# Altium footprint library connector.PcbLib: 227 footprints (part 2 of 15)
Each footprint in its own frame and in the unit in brackets; x right, y up, seen from the top. Pads: shape width x height; smd on the part's side, far side on the other; paste and mask are expansions set on the pad; w line width, h text height; cw(c..) or ccw(c..) is an arc to the next point about the centre after c.
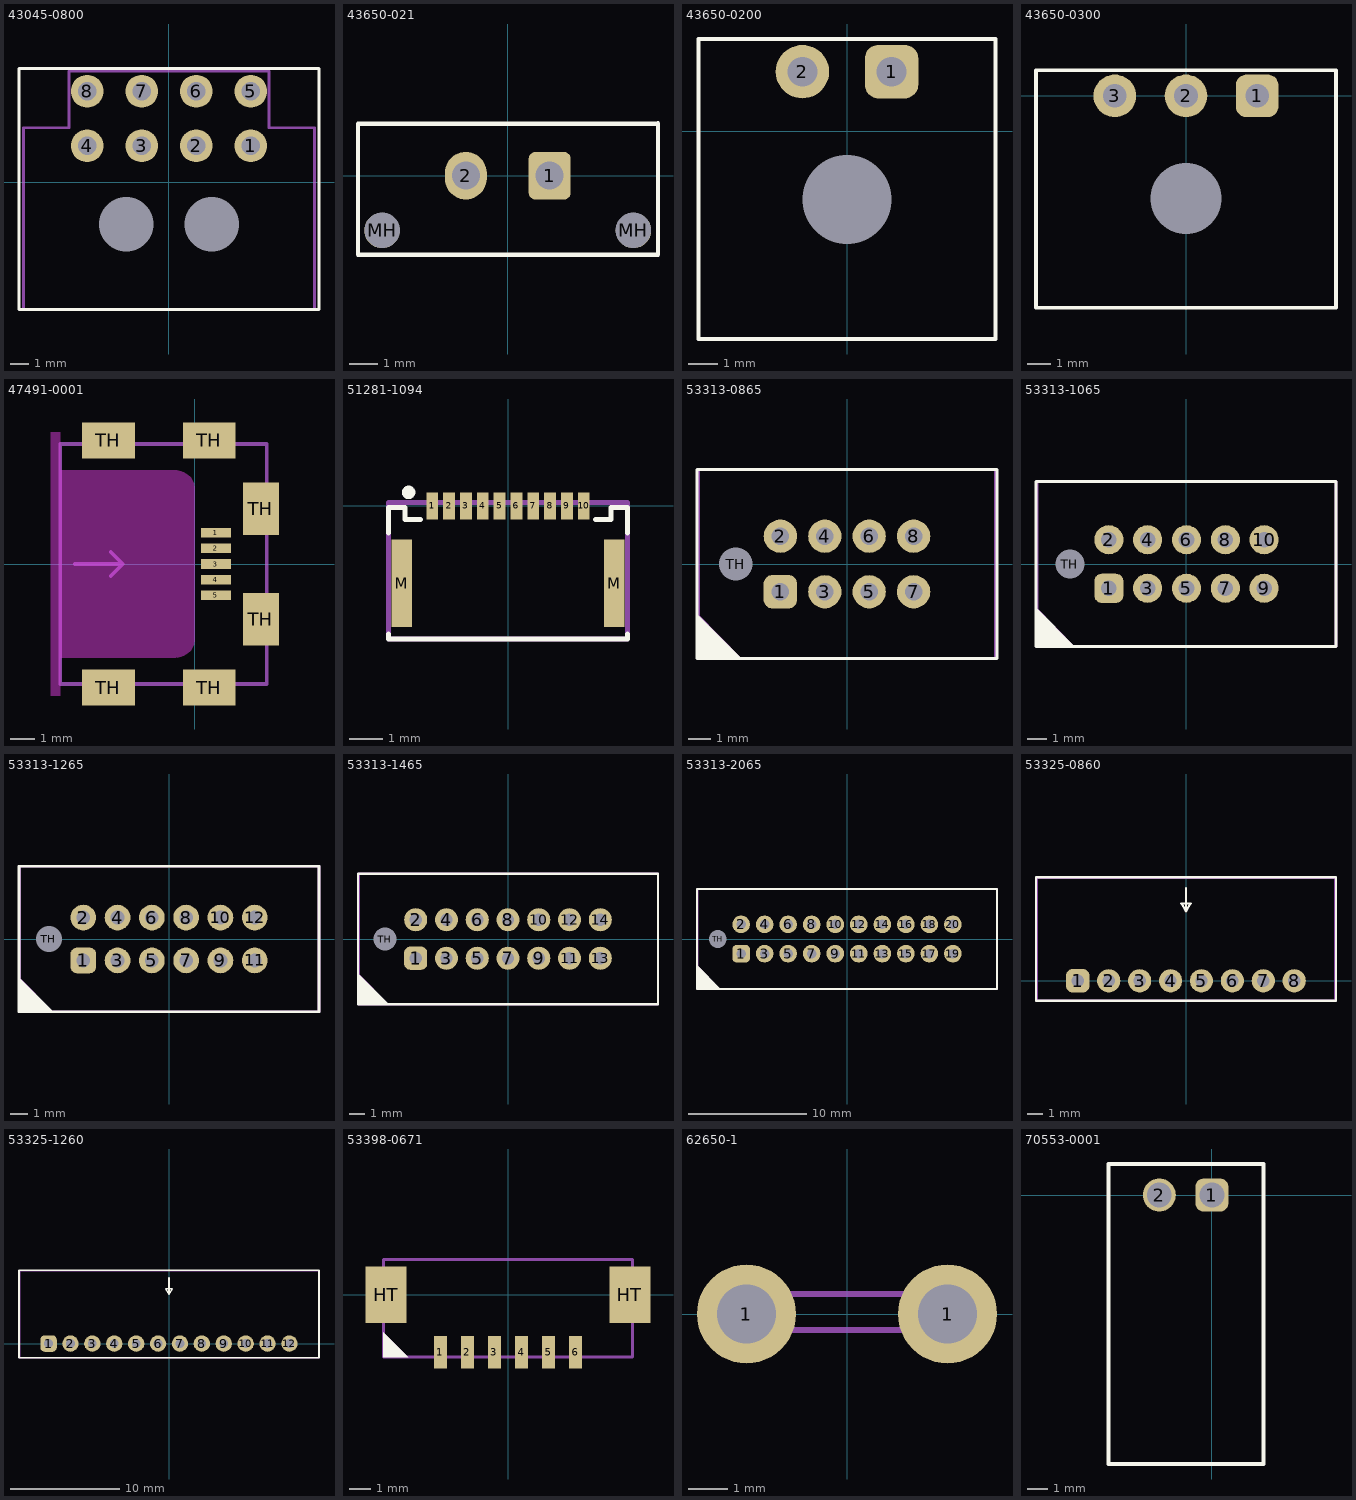
[diagram p1: the footprints below, top view; thin cyan lines are the x and y axes]

## 43045-0800 [mm] "Molex, Micro-Fit 3.0пїЅ Right Angle Header, 3.00mm Pitch, Dual Row, 8 Circuits, with Snap-in Plastic Peg PCB Lock, Tin, Glow Wire Capable, Black"
height 8.77
pads (10):
  round 1.8 hole 1: 1(4.5,2) 2(1.5,2) 3(-1.5,2) 4(-4.5,2) 5(4.5,5) 6(1.5,5) 7(-1.5,5) 8(-4.5,5)
  round 0 hole 3 unplated: MTB(-2.34,-2.32) MTB(2.34,-2.32)
Top Overlay:
  lines w0.15: -8.25,-7 8.25,-7 8.25,6.25 -8.25,6.25 -8.25,-7
Top Courtyard:
  lines w0.15: -8,-7 0,-7 8,-7 8,3 5.5,3 5.5,6.1 0,6.1 -5.5,6.1 -5.5,3 -8,3 -8,-7
3D body "430450800.stp": height 8.77, standoff -3.18, extent -8.075,-6.92 8.075,5.32

## 43650-021 [mm]
pads (4):
  rrect30% 1.5x1.7 hole 1: 1(1.5,0)
  oval 1.5x1.7 hole 1: 2(-1.5,0)
  round 1.27 hole 1.27 unplated: MH(-4.5,-1.96) MH(4.5,-1.96)
Top Overlay:
  lines w0.15: 5.378,1.861 -5.36,1.861 -5.36,-2.83 5.378,-2.83 5.378,1.879
3D body "436500215.stp": height 9.95, standoff -3.13, extent -4.825,-2.47 4.825,3.135

## 43650-0200 [mm]
pads (3):
  rrect50% 1.8x1.8 hole 1: 1(1.5,2)
  round 1.8 hole 1: 2(-1.5,2)
  round 0 hole 3 unplated: MTB(0,-2.3)
Top Overlay:
  lines w0.15: -5,-7 5,-7 5,3.1 -5,3.1 -5,-7
3D body "436500200.stp": height 5.64, standoff -3.27, extent -4.825,-6.85 4.825,3.05

## 43650-0300 [mm]
pads (4):
  rrect50% 1.8x1.8 hole 1: 1(3,0)
  round 1.8 hole 1: 2(0,0) 3(-3,0)
  round 0 hole 3 unplated: MTB(0,-4.32)
Top Overlay:
  lines w0.15: -6.325,-8.934 6.325,-8.934 6.325,1.081 -6.325,1.081 -6.325,-8.934
3D body "436500300.stp": height 5.64, standoff -3.27, extent -6.325,-8.95 6.325,0.95

## 47491-0001 [mm]
pads (11):
  rect 1.25x0.4 smd: 1(0.875,1.3) 2(0.875,0.65) 3(0.875,0) 4(0.875,-0.65) 5(0.875,-1.3)
  rect 2.2x1.5 smd: TH(-3.6,-5.15) TH(-3.6,5.15) TH(0.6,-5.15) TH(0.6,5.15)
  rect 1.5x2.2 smd: TH(2.75,-2.3) TH(2.75,2.3)
Keep-Out Layer:
  board cut-out: -6,-5.5 -6,5.5 -5.6,5.5 -5.6,3.9 -0.8,3.9 -0.721,3.9 -0.567,3.869 -0.421,3.809 -0.29,3.721 -0.179,3.61 -0.091,3.479 -0.031,3.333 0,3.179 0,3.1 0,-3.1 0,-3.179 -0.031,-3.333 -0.091,-3.479 -0.179,-3.61 -0.29,-3.721 -0.421,-3.809 -0.567,-3.869 -0.721,-3.9 -0.8,-3.9 -5.6,-3.9 -5.6,-5.5
Mechanical 29:
  lines w0.15: -5,0 -3,0 ; -3.5,-0.5 -3,0 ; -3.5,0.5 -3,0 ; -5.6,-5 3,-5 3,5 -5.6,5 -5.6,-5
  text ".Designator" at -4.5,2.7 h1
3D body "474910001.stp": height 1.47, standoff -1.47, extent -5.905,-5.5 3.225,5.5

## 51281-1094 [mm]
pads (12):
  rect 0.35x0.8 smd: 1(-2.25,0) 2(-1.75,0) 3(-1.25,0) 4(-0.75,0) 5(-0.25,0) 6(0.25,0) 7(0.75,0) 8(1.25,0) 9(1.75,0) 10(2.25,0)
  rect 0.6x2.6 smd: M(-3.15,-2.3) M(3.15,-2.3)
Top Overlay:
  circle w0.2: c-2.95,0.4 r0.1
  lines w0.15: -3.55,-3.8 -3.55,-3.95 3.55,-3.95 3.55,-3.8 ; -3.55,-0.8 -3.55,-0.05 -3.05,-0.05 -3.05,-0.4 -2.9,-0.4 -2.6,-0.4 ; 2.6,-0.4 2.9,-0.4 3.05,-0.4 3.05,-0.05 3.55,-0.05 3.55,-0.8
Top Courtyard:
  lines w0.15: -3.55,-3.95 3.55,-3.95 3.55,0.1 -3.55,0.1 -3.55,-3.95
3D body "512811094.stp": height 1.2, standoff 0, extent -3.55,-3.95 3.55,0.1

## 53313-0865 [mm]
height 7
pads (9):
  rrect50% 1.5x1.5 hole 0.8: 1(-3,-1.25)
  round 1.5 hole 0.8: 2(-3,1.25) 3(-1,-1.25) 4(-1,1.25) 5(1,-1.25) 6(1,1.25) 7(3,-1.25) 8(3,1.25)
  round 1 hole 1.5: TH(-5,0)
Top Overlay:
  region: -6.75,-2.25 -6.75,-4.25 -4.75,-4.25
  lines w0.15: -6.75,-4.25 -6.75,4.25 6.75,4.25 6.75,-4.25 -6.75,-4.25
Mechanical 29:
  region: -6.7,-2.257 -6.7,-4.25 -4.764,-4.25
  lines w0.15: -6.7,-4.25 6.7,-4.25 6.7,4.25 -6.7,4.25 -6.7,-4.25
  text ".Designator" at -3,-0.3 h1
3D body "533130865.stp": height 6.75, standoff -3.25, extent -6.7,-4.25 6.7,4.25

## 53313-1065 [mm]
height 7
pads (11):
  rrect50% 1.5x1.5 hole 0.8: 1(-4,-1.25)
  round 1.5 hole 0.8: 2(-4,1.25) 3(-2,-1.25) 4(-2,1.25) 5(0,-1.25) 6(0,1.25) 7(2,-1.25) 8(2,1.25) 9(4,-1.25) 10(4,1.25)
  round 1 hole 1.5: TH(-6,0)
Top Overlay:
  region: -7.75,-2.25 -7.75,-4.25 -5.75,-4.25
  lines w0.15: -7.75,-4.25 7.7,-4.25 7.7,4.25 -7.75,4.25 -7.75,-4.25
Mechanical 29:
  region: -7.7,-2.257 -7.7,-4.25 -5.764,-4.25
  lines w0.15: -7.7,-4.25 -7.7,4.25 7.7,4.25 7.7,-4.25 -7.7,-4.25
  text ".Designator" at -3,-0.3 h1
3D body "533131065.stp": height 6.75, standoff -3.25, extent -7.7,-4.25 7.7,4.25

## 53313-1265 [mm]
pads (13):
  rrect50% 1.5x1.5 hole 0.8: 1(-5,-1.25)
  round 1.5 hole 0.8: 2(-5,1.25) 3(-3,-1.25) 4(-3,1.25) 5(-1,-1.25) 6(-1,1.25) 7(1,-1.25) 8(1,1.25) 9(3,-1.25) 10(3,1.25) 11(5,-1.25) 12(5,1.25)
  round 1 hole 1.5: TH(-7,0)
Top Overlay:
  region: -8.75,-2.25 -8.75,-4.25 -6.75,-4.25
  lines w0.15: -8.75,-4.25 8.75,-4.25 8.75,4.25 -8.75,4.25 -8.75,-4.25
Mechanical 29:
  region: -8.7,-2.257 -8.7,-4.25 -6.764,-4.25
  lines w0.15: -8.7,-4.25 -8.7,4.25 8.75,4.25 8.75,-4.25 -8.7,-4.25
  text ".Designator" at -3,-0.3 h1
3D body "533131265.stp": height 6.75, standoff -3.25, extent -8.7,-4.25 8.7,4.25

## 53313-1465 [mm]
height 7
pads (15):
  rrect50% 1.5x1.5 hole 0.8: 1(-6,-1.25)
  round 1.5 hole 0.8: 2(-6,1.25) 3(-4,-1.25) 4(-4,1.25) 5(-2,-1.25) 6(-2,1.25) 7(0,-1.25) 8(0,1.25) 9(2,-1.25) 10(2,1.25) 11(4,-1.25) 12(4,1.25) 13(6,-1.25) 14(6,1.25)
  round 1 hole 1.5: TH(-8,0)
Top Overlay:
  region: -9.75,-2.25 -9.75,-4.25 -7.75,-4.25
  lines w0.15: -9.75,-4.25 -9.75,4.25 9.75,4.25 9.75,-4.25 -9.75,-4.25
Mechanical 29:
  region: -9.7,-2.257 -9.7,-4.25 -7.764,-4.25
  lines w0.15: -9.7,-4.25 9.75,-4.25 9.75,4.25 -9.7,4.25 -9.7,-4.25
  text ".Designator" at -3.5,-0.3 h1
3D body "533131465.stp": height 6.75, standoff -3.25, extent -9.7,-4.25 9.7,4.25

## 53313-2065 [mm]
height 7
pads (21):
  rrect50% 1.5x1.5 hole 0.8: 1(-9,-1.25)
  round 1.5 hole 0.8: 2(-9,1.25) 3(-7,-1.25) 4(-7,1.25) 5(-5,-1.25) 6(-5,1.25) 7(-3,-1.25) 8(-3,1.25) 9(-1,-1.25) 10(-1,1.25) 11(1,-1.25) 12(1,1.25) 13(3,-1.25) 14(3,1.25) 15(5,-1.25) 16(5,1.25) 17(7,-1.25) 18(7,1.25) 19(9,-1.25) 20(9,1.25)
  round 1 hole 1.5: TH(-11,0)
Top Overlay:
  region: -12.75,-2.25 -12.75,-4.25 -10.75,-4.25
  lines w0.15: -12.75,-4.25 12.75,-4.25 12.75,4.25 -12.75,4.25 -12.75,-4.25
Mechanical 29:
  region: -12.7,-2.257 -12.7,-4.25 -10.764,-4.25
  lines w0.15: -12.7,-4.25 -12.7,4.25 12.75,4.25 12.75,-4.25 -12.7,-4.25
  text ".Designator" at -3.5,-0.3 h1
3D body "533132065.stp": height 6.75, standoff -3.25, extent -12.65,-4.25 12.75,4.25

## 53325-0860 [mm]
height 5
pads (8):
  rrect50% 1.5x1.5 hole 0.8: 1(-7,0)
  round 1.5 hole 0.8: 2(-5,0) 3(-3,0) 4(-1,0) 5(1,0) 6(3,0) 7(5,0) 8(7,0)
Top Overlay:
  lines w0.15: 0,6 0,4.5 ; 0,4.5 -0.3,5 0.3,5 0,4.5 ; -9.7,-1.3 -9.7,6.7 9.7,6.7 9.7,-1.3 -9.7,-1.3
Mechanical 29:
  lines w0.15: -9.65,-1.3 9.65,-1.3 9.65,6.65 -9.65,6.65 -9.65,-1.3
  text ".Designator" at -3,3.2 h1
3D body "533250860.stp": height 4.95, standoff -3.4, extent -9.65,-1.3 9.65,6.65

## 53325-1260 [mm]
height 5
pads (12):
  rrect50% 1.5x1.5 hole 0.8: 1(-11,0)
  round 1.5 hole 0.8: 2(-9,0) 3(-7,0) 4(-5,0) 5(-3,0) 6(-1,0) 7(1,0) 8(3,0) 9(5,0) 10(7,0) 11(9,0) 12(11,0)
Top Overlay:
  lines w0.15: 0,6 0,4.5 ; 0,4.5 0.3,5 -0.3,5 0,4.5 ; -13.7,-1.3 13.7,-1.3 13.7,6.7 -13.7,6.7 -13.7,-1.3
Mechanical 29:
  lines w0.15: -13.65,-1.3 -13.65,6.65 13.7,6.65 13.7,-1.3 -13.65,-1.3
  text ".Designator" at -3.5,3.7 h1
3D body "533251260.stp": height 4.95, standoff -3.4, extent -13.65,-1.35 13.65,6.6

## 53398-0671 [mm] "Molex, LLC 0533980671, CONN HEADER 6POS 1.25MM VERT SMD"
height 4.8
pads (8):
  rect 0.6x1.5 smd: 1(-3.125,-2.65) 2(-1.875,-2.65) 3(-0.625,-2.65) 4(0.625,-2.65) 5(1.875,-2.65) 6(3.125,-2.65)
  rect 1.9x2.6 smd: HT(-5.625,0) HT(5.625,0)
Top Overlay:
  region: -5.75,-2.875 -5.75,-1.725 -4.6,-2.875
Mechanical 29:
  region: -5.75,-2.875 -5.75,-1.725 -4.6,-2.875
  lines w0.15: -5.75,-1.525 -5.75,-2.875 ; -3.6,-2.875 -5.75,-2.875 ; 3.6,-2.875 5.75,-2.875 ; 5.75,-1.525 5.75,-2.875 ; -5.75,-2.875 -5.75,1.625 ; -5.75,-2.875 5.75,-2.875 ; -5.75,1.625 5.75,1.625 ; -5.75,1.625 0,1.625 5.75,1.625 ; 5.75,-2.875 5.75,1.625
  text ".Designator" at -3.5,-0.3 h1
3D body "533980671.stp": height 4.7, standoff 0, extent -6.325,-2.75 6.325,1.45

## 62650-1 [mm]
height 10
pads (2):
  round 2.5 hole 1.5: 1(-2.54,0) 1(2.54,0)
Mechanical 29:
  lines w0.15: -3.5,-0.4 -3.5,0.5 3.5,0.5 3.5,-0.4 -3.5,-0.4
3D body "62650-1.STEP": height 9.19, standoff -3.18, extent -3.555,-0.42 3.555,0.42

## 70553-0001 [mm] "Molex, 2.54mm Pitch SLпїЅ Header, Low Profile, Single Row, Right Angle, 3.05mm Pocket, Shrouded, 2 Circuits, 0.38пїЅm Gold (Au) Selective Plating, Tin (Sn) PC Tail Plating"
pads (2):
  rrect50% 1.6x1.6 hole 1.2: 1(0,0)
  round 1.6 hole 1.2: 2(-2.54,0)
Top Overlay:
  lines w0.2: -5,-13 -5,1.5 2.5,1.5 2.5,-13 -5,-13
3D body "705530001.stp": height 6.98, standoff -3.3, extent -4.953,-12.89 2.413,0.699